# Altium footprint library mastermind.PCBLIB: 1061 footprints (part 25 of 67)
Each footprint in its own frame and in the unit in brackets; x right, y up, seen from the top. Pads: shape width x height; smd on the part's side, far side on the other; paste and mask are expansions set on the pad; w line width, h text height; cw(c..) or ccw(c..) is an arc to the next point about the centre after c.
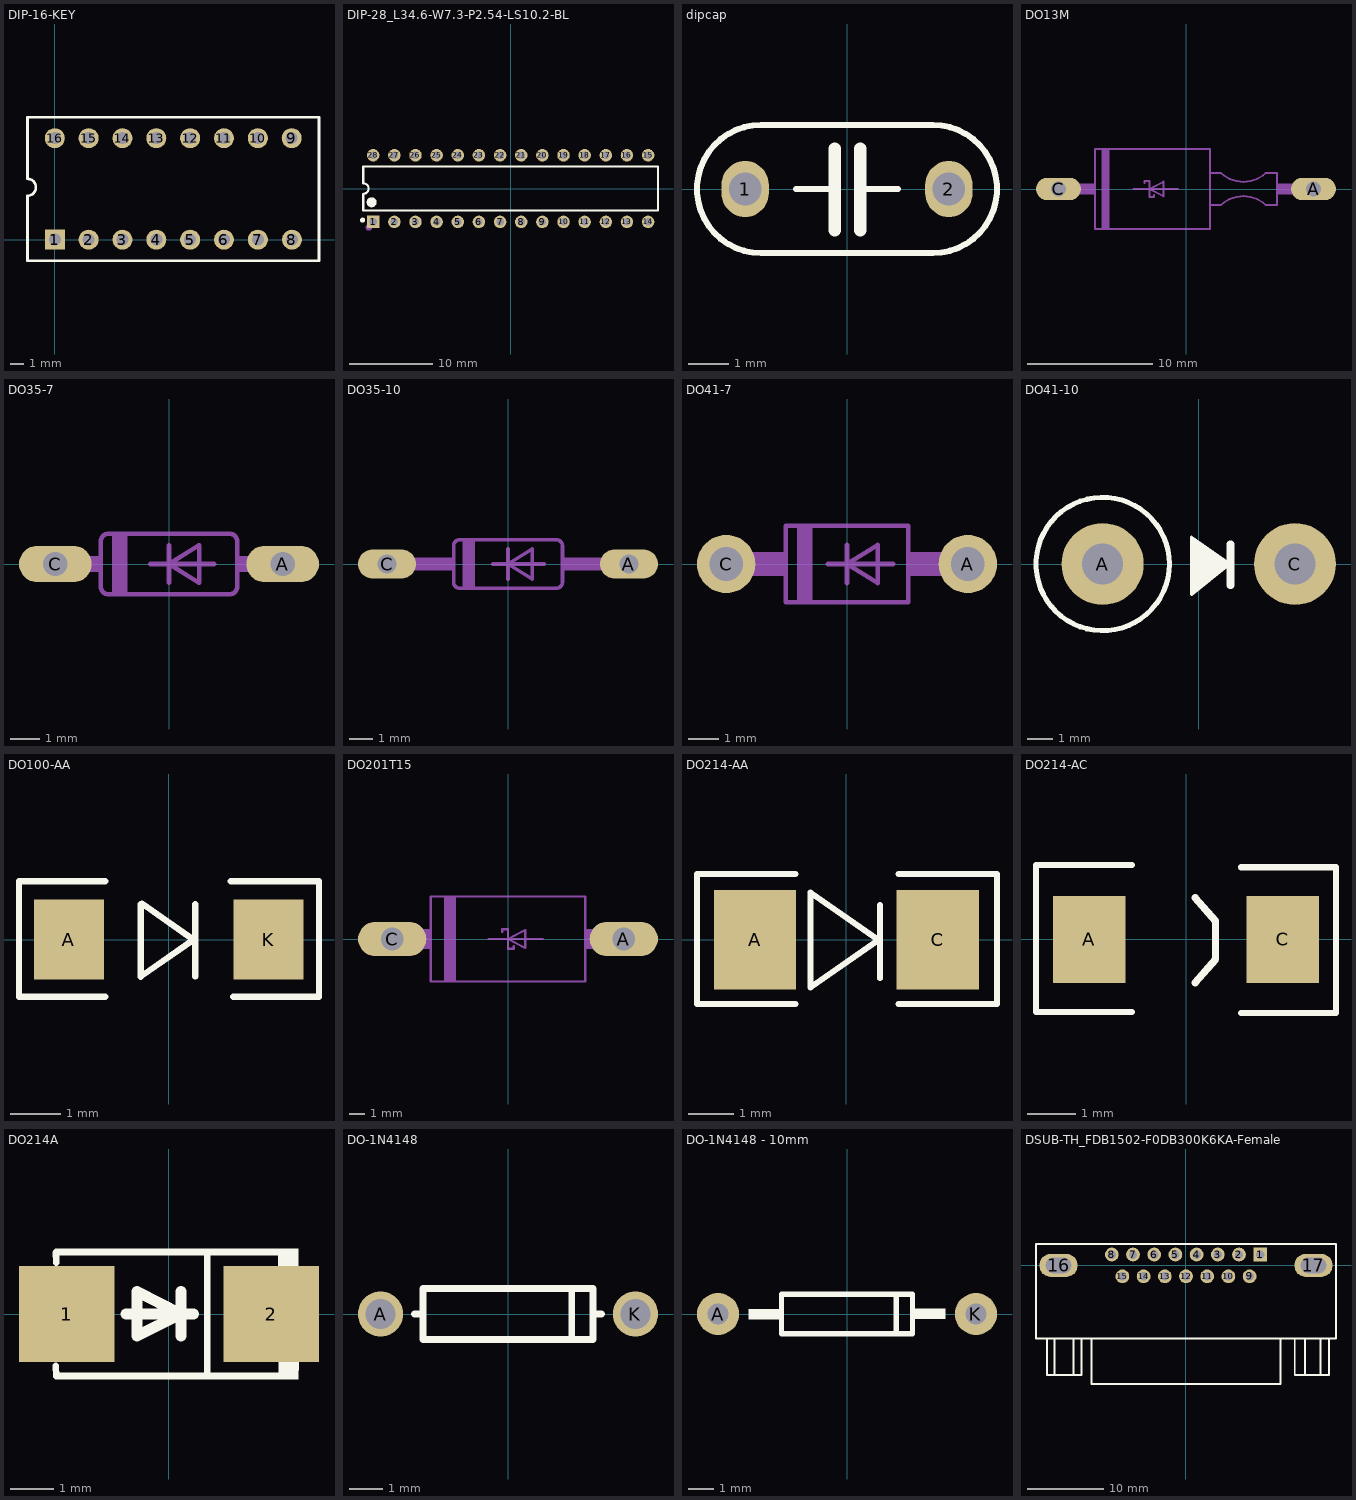
[diagram p24: the footprints below, top view; thin cyan lines are the x and y axes]

## DIP-16-KEY [mm]
pads (16):
  rect 1.5x1.5 hole 0.9: 1(-0.011,0.001)
  round 1.5 hole 0.9: 2(2.529,0.001) 3(5.069,0.001) 4(7.609,0.001) 5(10.149,0.001) 6(12.689,0.001) 7(15.229,0.001) 8(17.789,0.001) 9(17.769,7.621) 10(15.229,7.621) 11(12.689,7.621) 12(10.149,7.621) 13(7.609,7.621) 14(5.069,7.621) 15(2.529,7.621) 16(-0.011,7.621)
Top Overlay:
  lines w0.2: -2.061,4.571 cw(c-2.061,3.936) -2.061,3.301 -2.061,-1.589 19.819,-1.589 19.819,9.201 -2.061,9.201 -2.061,4.601
3D body: height 6.35, standoff 0, extent -2.032,-1.524 19.812,9.144
3D body: height 7.11, standoff 0, extent -0.508,4.064 0.508,6.096
3D body: height 6.48, standoff 0, extent -0.508,1.524 0.508,4.064
3D body: height 6.48, standoff 0, extent 4.572,1.524 5.588,4.064
3D body: height 7.11, standoff 0, extent 4.572,4.064 5.588,6.096
3D body: height 6.48, standoff 0, extent 7.112,1.524 8.128,4.064
3D body: height 7.11, standoff 0, extent 7.112,4.064 8.128,6.096
3D body: height 6.48, standoff 0, extent 14.732,1.524 15.748,4.064
3D body: height 7.11, standoff 0, extent 14.732,4.064 15.748,6.096
3D body: height 6.48, standoff 0, extent 2.032,3.556 3.048,6.096
3D body: height 7.11, standoff 0, extent 2.032,1.524 3.048,3.556
3D body: height 6.48, standoff 0, extent 9.652,3.556 10.668,6.096
3D body: height 7.11, standoff 0, extent 9.652,1.524 10.668,3.556
3D body: height 6.48, standoff 0, extent 12.192,3.556 13.208,6.096
3D body: height 7.11, standoff 0, extent 12.192,1.524 13.208,3.556
3D body: height 6.48, standoff 0, extent 17.272,3.556 18.288,6.096
3D body: height 7.11, standoff 0, extent 17.272,1.524 18.288,3.556

## DIP-28_L34.6-W7.3-P2.54-LS10.2-BL [mm]
pads (28):
  rect 1.5x1.5 hole 0.9 paste-2539.97 mask+0.051: 1(-16.51,-4)
  round 1.5 hole 0.9 paste-2539.97 mask+0.051: 2(-13.97,-4) 3(-11.43,-4) 4(-8.89,-4) 5(-6.35,-4) 6(-3.81,-4) 7(-1.27,-4) 8(1.27,-4) 9(3.81,-4) 10(6.35,-4) 11(8.89,-4) 12(11.43,-4) 13(13.97,-4) 14(16.51,-4) 15(16.51,4) 16(13.97,4) 17(11.43,4) 18(8.89,4) 19(6.35,4) 20(3.81,4) 21(1.27,4) 22(-1.27,4) 23(-3.81,4) 24(-6.35,4) 25(-8.89,4) 26(-11.43,4) 27(-13.97,4) 28(-16.51,4)
Top Overlay:
  lines w0.254: -17.701,-0.635 ccw(c-17.701,0) -17.701,0.635 ; -17.7,-0.635 -17.7,-2.65 17.7,-2.65 17.7,2.65 -17.7,2.65 -17.7,0.635
  lines w0.3: -17.94,-3.8 ccw(c-17.79,-3.799) -17.94,-3.797
  lines w0.6: -17,-1.651 ccw(c-16.7,-1.648) -17,-1.646
Mechanical 15:
  circle w0.4: c-17.026,-4.657 r0.2
3D body "DIP28.STEP": height 4.7, standoff -2.6, extent -17.6,-3.735 17.6,4.135

## dipcap [mm]
pads (2):
  oval 1.18x1.4 hole 0.813: 1(-2.54,0) 2(2.54,0)
Top Overlay:
  lines w0.152: -2.14,-1.6 2.14,-1.6 ; -2.14,1.6 2.14,1.6 ; -1.27,0 -0.305,0 ; 0.33,0 1.27,0
  lines w0.153: -2.14,-1.6 cw(c-2.14,0) -2.14,1.6 ; 2.14,-1.6 ccw(c2.14,0) 2.14,1.6
  lines w0.305: -0.305,-1.03 -0.305,0 -0.305,1.01 ; 0.33,-1.03 0.33,0 0.33,1.01
Mechanical 8:
  region: 2.159,-0.381 2.159,0.381 2.54,0.381 2.54,-0.381
  region: -2.54,-0.381 -2.54,0.381 -2.159,0.381 -2.159,-0.381
3D body "User Library-Film Capacitor 6x8mm (1)1.STEP": height 13.72, standoff -2.26, extent -3.772,-1.508 3.772,1.492

## DO13M [mil]
pads (2):
  oval 141x70.5 hole 47: A(400,0) C(-400,0)
Mechanical 2:
  region: -265,-125 -265,125 -240,125 -240,-125
  region: -343,-17 -343,17 -285,17 -285,-17
  region: 285,-17 285,17 343,17 343,-17
  lines w6: -165,0 -115,0 ; -130,18 -130,25 -115,25 -115,0 ; -100,-18 -100,-25 -115,-25 -115,0 ; -25,0 -115,0 ; -115,0 -70,-23 -70,23 -115,0 ; 75,-50 110,-50 cw(c180,-125) 250,-50 285,-50 285,50 250,50 cw(c180,125) 110,50 75,50 ; 75,-50 75,50 ; 75,-50 75,-125 -285,-125 -285,125 75,125 75,50
Mechanical 8:
  lines w36: -400,0 -340,0 ; 340,0 400,0

## DO35-7 [mil]
pads (2):
  oval 96x48 hole 32: A(150,0) C(-150,0)
Mechanical 2:
  region: -115,-10 -115,10 -90,10 -90,-10
  region: 90,-10 90,10 115,10 115,-10
  region: -75,-40 -75,40 -55,40 -55,-40
  lines w6: -25,0 0,0 ; 0,-25 0,0 ; 0,25 0,0 ; 60,0 0,0 ; 0,0 40,25 40,-25 0,0 ; -90,-30 ccw(c-80,-30) -80,-40 80,-40 ccw(c80,-30) 90,-30 90,30 ccw(c80,30) 80,40 -80,40 ccw(c-80,30) -90,30 -90,-30
Mechanical 8:
  lines w20: -150,0 -115,0 ; 115,0 150,0

## DO35-10 [mil]
pads (2):
  oval 96x48 hole 32: A(200,0) C(-200,0)
Mechanical 2:
  region: -75,-40 -75,40 -55,40 -55,-40
  region: 90,-10 90,10 165,10 165,-10
  region: -165,-10 -165,10 -90,10 -90,-10
  lines w6: -25,0 0,0 ; 0,-25 0,0 ; 0,25 0,0 ; 60,0 0,0 ; 0,0 40,-25 40,25 0,0 ; -90,-30 ccw(c-80,-30) -80,-40 80,-40 ccw(c80,-30) 90,-30 90,30 ccw(c80,30) 80,40 -80,40 ccw(c-80,30) -90,30 -90,-30
Mechanical 8:
  lines w20: -200,0 -165,0 ; 165,0 200,0

## DO41-7 [mil]
pads (2):
  round 76 hole 44: A(157.48,0) C(-157.48,0)
Mechanical 2:
  region: -65,-50 -65,50 -45,50 -45,-50
  region: 80,-15 80,15 155,15 155,-15
  region: -155,-15 -155,15 -80,15 -80,-15
  lines w6: -25,0 0,0 ; 0,-25 0,0 ; 0,25 0,0 ; 60,0 0,0 ; 0,0 40,-25 40,25 0,0 ; -80,-50 80,-50 80,50 -80,50 -80,-50

## DO41-10 [mm]
pads (2):
  round 3.2 hole 1.6: A(-3.75,0) C(3.75,0)
Top Overlay:
  region: -0.286,1.047 -0.286,-1.188 1.204,0.004
  lines w0.127: -0.286,-1.188 -0.286,1.047 1.204,0.004 -0.286,-1.188
  lines w0.2: -1.15,-0.002 cw(c-3.75,0) -1.15,0
  lines w0.3: 1.238,-0.832 1.238,0.768
3D body "DO-201AE_Min_250mil_rev1.0.STEP": height 13.61, standoff -2.6, extent -5.085,-2.5 4.085,2.2

## DO100-AA [mm]
pads (2):
  rect 1.4x1.6 smd: A(-2,0) K(2,0)
Top Overlay:
  lines w0.127: -1.27,-1.143 -2.997,-1.143 -2.997,1.168 -1.27,1.168 ; -0.559,0.711 -0.559,-0.74 0.499,-0.002 -0.533,0.721 ; 0.533,-0.737 0.533,0.711 ; 1.245,1.168 3.009,1.168 3.009,-1.143 1.295,-1.143
3D body "User Library-MiniMelf-2.STEP": height 1.6, standoff 0, extent -1.82,-0.8 1.88,0.8

## DO201T15 [mil]
pads (2):
  oval 177x88.5 hole 59: A(300,0) C(-300,0)
Mechanical 2:
  region: -165,-110 -165,110 -135,110 -135,-110
  region: -235,-25 -235,25 -200,25 -200,-25
  region: 200,-25 200,25 235,25 235,-25
  lines w6: -50,0 0,0 ; -15,18 -15,25 0,25 0,0 ; 15,-18 15,-25 0,-25 0,0 ; 90,0 0,0 ; 0,0 45,23 45,-23 0,0 ; -200,-110 -200,110 200,110 200,-110 -200,-110
Mechanical 8:
  lines w50: -300,0 -245,0 ; 245,0 300,0

## DO214-AA [mm]
pads (2):
  rect 1.8x2.18 smd: A(-2,0) C(2,0)
Top Overlay:
  lines w0.127: -3.271,-1.4 -1.112,-1.4 ; -3.271,-1.38 -3.271,1.42 ; -3.271,1.44 -1.112,1.44 ; 0.737,-0.838 0.737,0.762 ; 1.138,-1.4 3.297,-1.4 ; 1.138,1.44 3.297,1.44 ; 3.297,-1.38 3.297,1.42 ; -0.787,-1.041 0.703,-0.002 -0.787,1.041 -0.787,-1.041
3D body "User Library-S1G-1.step": height 2.7, standoff 0, extent -2.648,-1.551 2.952,1.399

## DO214-AC [mm]
pads (2):
  rect 1.5x1.8 smd: A(-2,0) C(2,0)
Top Overlay:
  lines w0.127: -1.112,-1.501 -3.099,-1.501 -3.099,1.535 -1.112,1.535 ; 1.138,-1.521 3.099,-1.521 3.099,1.489 1.138,1.489
  lines w0.152: 0.192,-0.895 0.61,-0.417 0.61,0.381 0.192,0.858
3D body "User Library-S1G-1.step": height 2.7, standoff 0, extent -2.787,-1.501 2.813,1.449

## DO214A [mm]
pads (2):
  rect 2.2x2.2 smd paste+0 mask+0.051: 1(-2.35,0) 2(2.35,0)
Top Overlay:
  region: 2.512,1.096 2.513,1.503 2.973,1.498 2.969,1.096
  region: 2.52,-1.502 2.521,-1.096 2.981,-1.1 2.977,-1.502
  lines w0.152: -2.603,-1.187 -2.596,-1.426 2.596,-1.426 ; -2.6,1.415 -2.593,1.176 ; -2.596,1.426 2.596,1.426 ; 0.884,-1.426 0.884,1.426
  lines w0.254: -0.984,0.005 0.565,0.005 ; 0.276,-0.503 0.276,0.513 0.276,0.005 ; 0.276,0.005 -0.74,-0.503 -0.74,0.513 0.276,0.005
Mechanical 15:
  region: -2.014,0.675 -2.014,-0.675 -1.811,-0.675 -1.811,0.675
  region: -2.29,0.09 -2.29,-0.112 -1.48,-0.112 -1.48,0.09
  region: 2.317,0.101 2.317,-0.101 1.507,-0.101 1.507,0.101
3D body "User Library-S1G-1.step": height 2.7, standoff 0, extent -2.576,-1.445 3.024,1.505

## DO-1N4148 [mm]
pads (2):
  round 1.35 hole 0.9: A(-3.81,0) K(3.81,0)
Top Overlay:
  lines w0.203: -2.794,0 -2.54,0 ; 1.905,-0.635 1.905,0.635 ; 2.794,0 2.54,0 ; -2.54,0 -2.54,0.762 2.54,0.762 2.54,0 ; -2.54,0 -2.54,-0.762 2.54,-0.762 2.54,0

## DO-1N4148 - 10mm [mm]
pads (2):
  round 1.63 hole 0.8: A(-5,0) K(5,0)
Top Overlay:
  rectangle: 2.539,-0.194 3.824,0.206
  region: -2.529,0.195 -3.814,0.195 -3.814,-0.205 -2.529,-0.205
  lines w0.203: 1.905,-0.635 1.905,0.635 ; -2.54,-0.762 2.54,-0.762 2.54,0 2.54,0.762 -2.54,0.762 -2.54,0 -2.54,-0.762
3D body "DIODE-1N4148.STEP": height 1.85, standoff -2.5, extent -5.31,-0.853 5.31,0.853

## DSUB-TH_FDB1502-F0DB300K6KA-Female [mm]
pads (17):
  rect 1.8x1.8 hole 1.1: 1(9.695,1.42)
  round 1.8 hole 1.1: 2(6.925,1.42) 3(4.155,1.42) 4(1.385,1.42) 5(-1.385,1.42) 6(-4.155,1.42) 7(-6.925,1.42) 8(-9.695,1.42) 9(8.31,-1.42) 10(5.54,-1.42) 11(2.77,-1.42) 12(0,-1.42) 13(-2.77,-1.42) 14(-5.54,-1.42) 15(-8.31,-1.42)
  oval 5x3.048 hole 2.032 slot 3.3 at 0 deg: 16(-16.66,0) 17(16.66,0)
Top Overlay:
  lines w0.254: -18.153,-9.52 -18.153,-14.32 -13.653,-14.32 -13.653,-9.52 ; -17.162,-14.32 -17.162,-9.52 ; -14.672,-14.32 -14.672,-9.52 ; -12.33,-9.52 -12.33,-15.52 12.33,-15.52 12.33,-9.52 ; 14.211,-9.52 14.211,-14.32 18.711,-14.32 18.711,-9.52 ; 15.521,-14.32 15.521,-9.52 ; 17.579,-14.32 17.579,-9.52 ; -19.6,-9.52 19.6,-9.52 19.6,2.83 -19.6,2.83 -19.6,-9.52